# Altium schematic symbol library SCHLIB.SchLib: 2608 symbols (part 3 of 20)
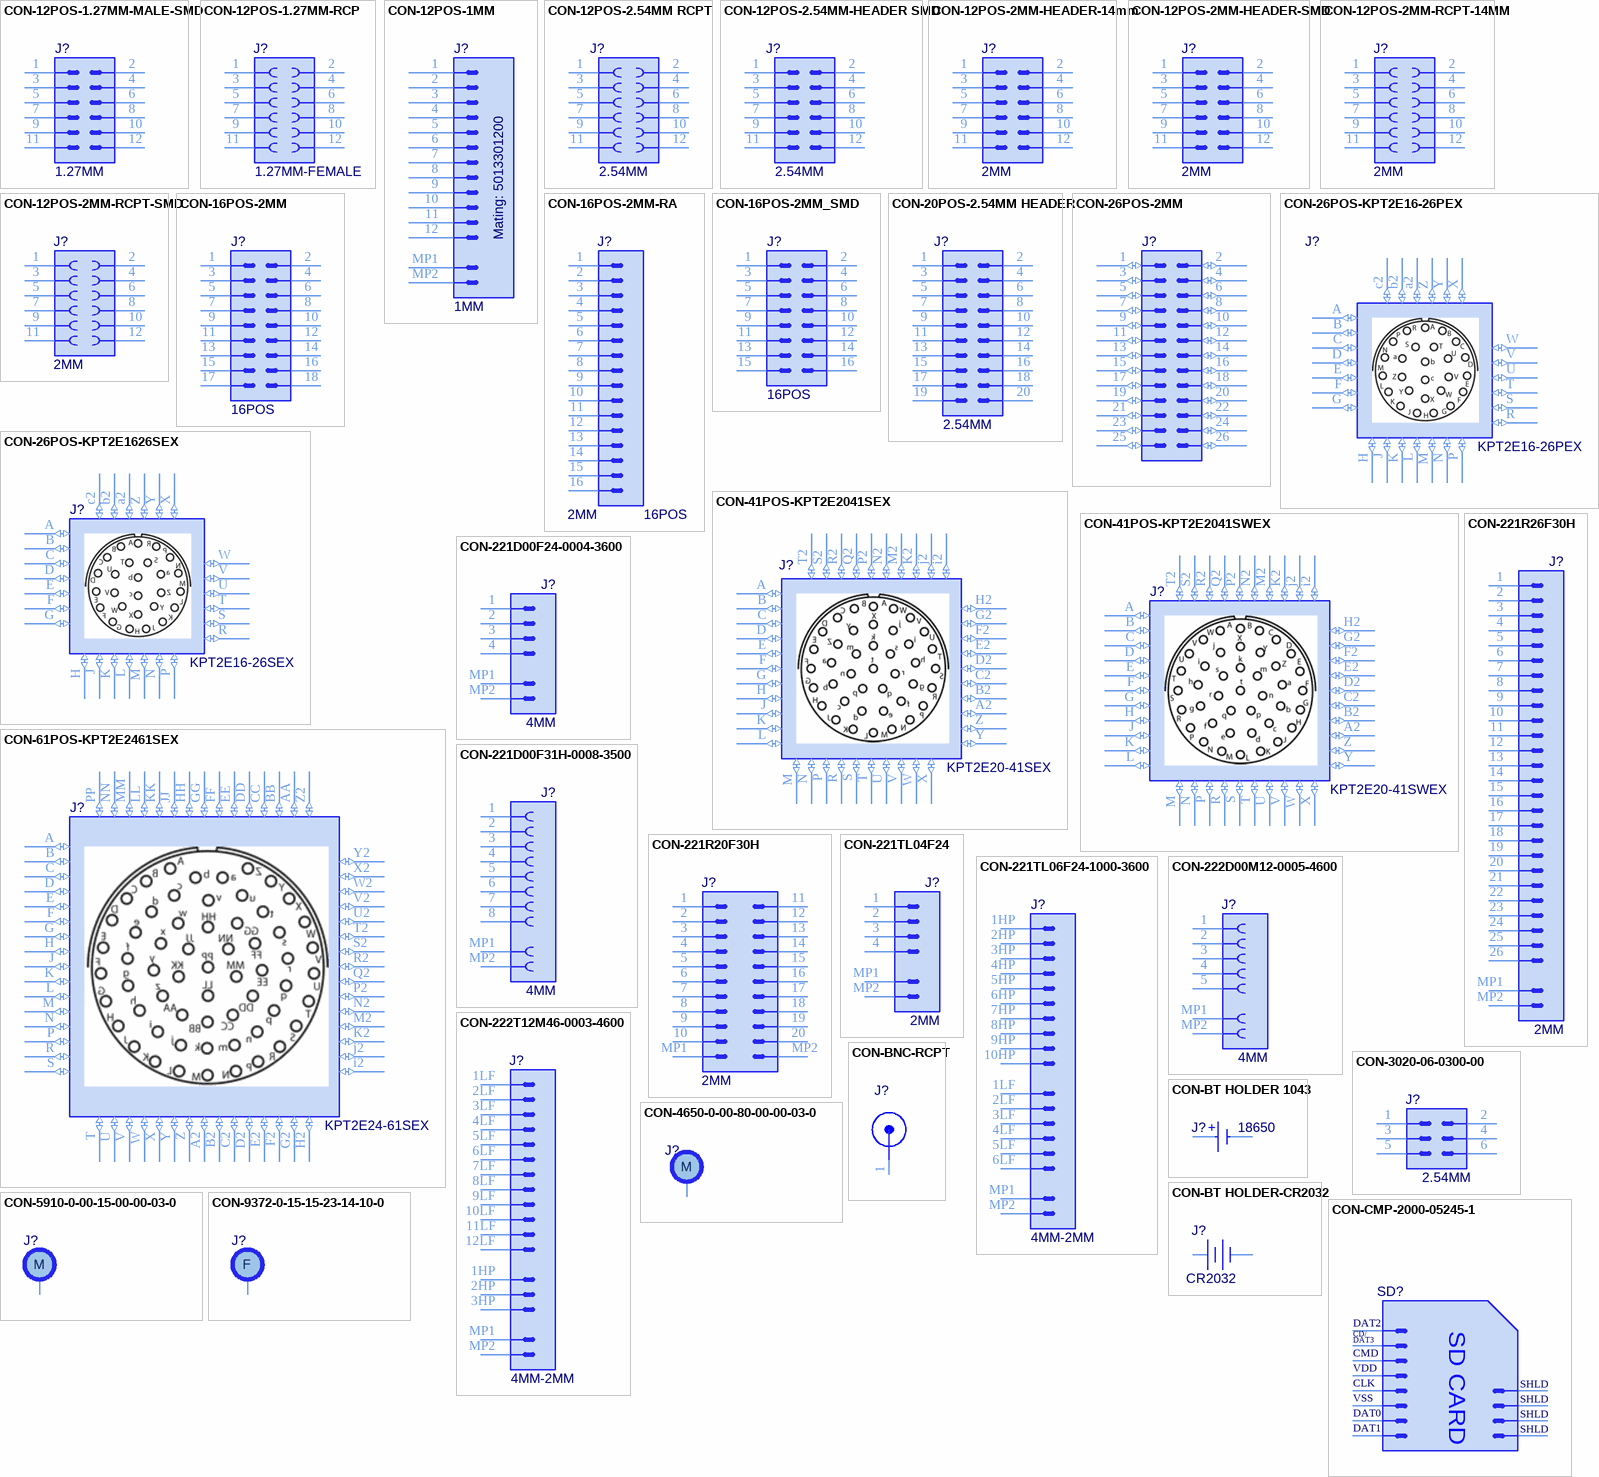
[diagram p85: symbols CON-12POS-1.27MM-MALE-SMD to CON-CMP-2000-05245-1]

## CON-61POS-KPT2E2461SEX
designator J?, comment KPT2E24-61SEX
KPT 61C 61#20 SKT RECP; Manufacturer: ITT Cannon; Body Material: Aluminium; Body Plating: Cadmium; Connector Type: Receptacle,Circular; Number of Positions: 61; Gender: Receptacle; Current Rating: 7.5A; Ratings: Environment Resistant; Washability: OK; Supplier 1: Digi-Key; Supplier Part Number 1: IKPT2E24-61SEX-ND; Manufacturer Part Number: KPT2E24-61SEX; Stock: 305; Pricing: 1=103.65, 10=90.546, 25=85.7808, 50=81.0152, 100=79.2281 (USD); RoHS: Yes; Mount: Through Hole,Panel,Flanges; Contact Material: Copper Alloy; Contact Plating: Gold; Min Operating Temperature: -55°C; Max Operating Temperature: 125°C; Termination: Solder; Number of Contacts: 61; Package Quantity: 1; Fastening Type: Bayonet; Packaging: Bulk; REACH SVHC: No SVHC; ComponentLink1URL: https://datasheet.ciiva.com/7961/1811874-7961718.pdf?src-supplier=Element14; ComponentLink1Description: https://datasheet.ciiva.com/7961/1811874-7961718.pdf?src-supplier=Element14
footprint CON-61POS-KPT2E2461SEX
pins: A (io), A2 (io), AA (io), B (io), B2 (io), BB (io), C (io), C2 (io), CC (io), D (io), D2 (io), DD (io), E (io), E2 (io), EE (io), F (io), F2 (io), FF (io), G (io), G2 (io), GG (io), H (io), H2 (io), HH (io), i2 (io), J (io), j2 (io), JJ (io), K (io), K2 (io), KK (io), L (io), LL (io), M (io), M2 (io), MM (io), N (io), N2 (io), NN (io), P (io), P2 (io), PP (io), Q2 (io), R (io), R2 (io), S (io), S2 (io), T (io), T2 (io), U (io), U2 (io), V (io), V2 (io), W (io), W2 (io), X (io), X2 (io), Y (io), Y2 (io), Z (io), Z2 (io)

## CON-221D00F24-0004-3600
designator J?, comment 4MM
CMM Series 220 MALE; Manufacturer Part Number: 221D00F24-0004-3600; Manufacturer: NICOMATIC
footprint CON-221D00F24-0004-3600
pins: 1, 2, 3, 4, MP1, MP2

## CON-221D00F31H-0008-3500
designator J?, comment 4MM
CMM 220 FEMALE 90° SMT; Manufacturer: NICOMATIC; Manufacturer Part Number: 221D00F31H-0008-3500; Mating: 222E00M16-0008-4320
footprint CON-221D00F31H-0008-3500
pins: 1, 2, 3, 4, 5, 6, 7, 8, MP1, MP2

## CON-221R20F30H
designator J?, comment 2MM
CMM 220 MALE 90° SMT; Manufacturer Part Number: 221R20F30H; Manufacturer: NICOMATIC; Mating: 222S20M16
footprint CON-221R20F30H
pins: 1, 2, 3, 4, 5, 6, 7, 8, 9, 10, 11, 12, 13, 14, 15, 16, 17, 18, 19, 20, MP1, MP2

## CON-221R26F30H
designator J?, comment 2MM
CMM 220 MALE 90° SMT; Manufacturer Part Number: 221R26F30H; Manufacturer: NICOMATIC; Mating: 222S26M16
footprint CON-221R26F30H
pins: 1, 2, 3, 4, 5, 6, 7, 8, 9, 10, 11, 12, 13, 14, 15, 16, 17, 18, 19, 20, 21, 22, 23, 24, 25, 26, MP1, MP2

## CON-221TL04F24
designator J?, comment 2MM
CMM 220 MALE STRAIGHT SMT; Manufacturer Part Number: 221TL04F24; Manufacturer: NICOMATIC; Mating: 222S04M16
footprint CON-221TL04F24
pins: 1, 2, 3, 4, MP1, MP2

## CON-221TL06F24-1000-3600
designator J?, comment 4MM-2MM
CMM 220 MALE STRAIGHT SMT; Manufacturer Part Number: 221TL06F24-1000-3600; Manufacturer: NICOMATIC; Mating: 222C06M16-1000-4320
footprint CON-221TL06F24-1000-3600
pins: 1HP, 1LF, 2HP, 2LF, 3HP, 3LF, 4HP, 4LF, 5HP, 5LF, 6HP, 6LF, 7HP, 8HP, 9HP, 10HP, MP1, MP2

## CON-222D00M12-0005-4600
designator J?, comment 4MM
CMM 220 FEMALE 90° SMT; Manufacturer Part Number: 222D00M12-0005-4600; Manufacturer: NICOMATIC; Mating: 221E00F21-0005-3320
footprint CON-222D00M12-0005-4600
pins: 1, 2, 3, 4, 5, MP1, MP2

## CON-222T12M46-0003-4600
designator J?, comment 4MM-2MM
CMM Series 220 MALE; Manufacturer Part Number: 222T12M46-0003-4600; Manufacturer: NICOMATIC; Mating: 221S12F60-0003-3320
footprint CON-222T12M46-0003-4600
pins: 1HP, 1LF, 2HP, 2LF, 3HP, 3LF, 4LF, 5LF, 6LF, 7LF, 8LF, 9LF, 10LF, 11LF, 12LF, MP1, MP2

## CON-3020-06-0300-00
designator J?, comment 2.54MM
CONN HEADER SMD 6POS 2.54MM; Manufacturer: CNC Tech; Manufacturer Part Number: 3020-06-0300-00; Number of Positions: 6; Connector Type: Male Pin; Pitch: 0.1inch; Supplier 1: Digi-Key; RoHS: Yes; Category: Connectors; Stock 1: 1374; Pricing 1: 1=0,48000, 10=0,45000, 100=0,34500, 500=0,30000, 1000=0,24750, 5000=0,21750, 10000=0,20250 (USD); Mount: Surface Mount; Contact Plating: Gold; Package Quantity: 180; Number of Rows: 2; Packaging: Tray; Termination: Solder; Row Spacing: 0.1inch; ComponentLink1URL: http://cnctech.us/pdfs/3020-XX-0300-00.pdf?src-supplier=Digi-Key; ComponentLink1Description: http://cnctech.us/pdfs/3020-XX-0300-00.pdf?src-supplier=Digi-Key; ComponentLink2URL: http://cnctech.us/idcmatching2.pdf?src-supplier=Digi-Key; ComponentLink2Description: http://cnctech.us/idcmatching2.pdf?src-supplier=Digi-Key; Supplier Part Number 1: 1175-1864-ND
footprint CON-3020-06-0300-00
pins: 1, 2, 3, 4, 5, 6

## CON-4650-0-00-80-00-00-03-0
designator J?, comment M
CONN PC PIN CIRC; Manufacturer: Mill-Max; Manufacturer Part Number: 4650-0-00-80-00-00-03-0; Insulation: Non-Insulated; Supplier 1: Digi-Key; Supplier Part Number 1: ED10167-ND; Stock: 896; Pricing: 1=0.77, 10=0.677, 25=0.6368, 50=0.6102, 100=0.5837, 250=0.5306, 500=0.4775, 1000=0.4245, 2500=0.3847 (USD); RoHS: No; Mount: Through Hole; Contact Material: Brass; Contact Plating: Tin; Packaging: Bulk; Termination: PC Pin; ComponentLink1URL: https://www.mill-max.com/assets/pdfs/223.3.pdf?src-supplier=Digi-Key; ComponentLink1Description: https://www.mill-max.com/assets/pdfs/223.3.pdf?src-supplier=Digi-Key
footprint CON-4650
pins: 1

## CON-5910-0-00-15-00-00-03-0
designator J?, comment M
SOLDER MOUNT NAIL HEAD PIN; Manufacturer: Mill-Max; Manufacturer Part Number: 5910-0-00-15-00-00-03-0; Supplier 1: Digi-Key; Supplier Part Number 1: 54-5910-0-00-15-00-00-03-0-ND; Stock: 348; Pricing: 1=0.84, 10=0.738, 25=0.6948, 50=0.6658, 100=0.6369, 250=0.579, 500=0.5211, 1000=0.4632, 2500=0.4198 (USD); RoHS: No; ComponentLink1Description: datasheet; ComponentLink1URL: https://www.mill-max.com/products/datasheet/pinsrecs/5910-0-00-15-00-00-03-0
footprint CON-5910
pins: 1

## CON-9372-0-15-15-23-14-10-0
designator J?, comment F
CONN PIN RCPT; Manufacturer: Mill-Max; Manufacturer Part Number: 9372-0-15-15-23-14-10-0; Supplier 1: Digi-Key; Supplier Part Number 1: 9372-0-15-15-23-14-10-0-ND; Stock: 1000; Pricing: 1=1.53, 10=1.388, 25=1.3032, 50=1.2466, 100=1.1899, 250=1.0766, 500=0.9916, 1000=0.8499 (USD); RoHS: Yes; Mount: Through Hole; Packaging: Bulk; Package Quantity: 500; ComponentLink1URL: https://datasheet.ciiva.com/12491/159n-58938-12491735.pdf?src-supplier=Mouser; ComponentLink1Description: https://datasheet.ciiva.com/12491/159n-58938-12491735.pdf?src-supplier=Mouser
footprint CON-9372
pins: 1

## CON-BNC-RCPT
designator J?, comment CONN BNC RCPT STR 75 OHM SOLDER  (value not drawn)
BNC Connector Jack, Female Socket 75Ohm Panel Mount Solder Cup; Manufacturer 1: Pomona Electronics; Manufacturer Part Number 1: 6736; Body Material: Brass; Plating: Nickel; Dielectric Material: PTFE; Voltage Rating: 500V; Connector Type: BNC,Socket,Plug,Coaxial; Polarity: Standard; Impedance: 75R; Max Frequency: 3GHz; Insulation Resistance: 5GR; Washability: OK; Supplier 1: Digi-Key; Stock 1: 290; Pricing 1: 1=6,49000, 25=6,16560, 50=5,84100, 100=5,58140 (USD); RoHS: Yes; Mount: Panel,Flanges,Bulkhead; Contact Plating: Gold; Contact Material: Copper,Brass; Body Plating: Nickel; Housing Color: Silver; Material: Brass; Insulation Material: Teflon; Housing Material: Brass; Min Operating Temperature: -65°C; Max Operating Temperature: 155°C; Package Quantity: 5; Gender: Female; Termination: Solder; Orientation: Vertical; Fastening Type: Bayonet; Packaging: Bulk; Frequency: 3GHz; REACH SVHC: No SVHC; Lead Free: Lead Free; ComponentLink1URL: https://datasheet.ciiva.com/644/d6735-6736-004-644064.pdf?src-supplier=Digi-Key; ComponentLink1Description: https://datasheet.ciiva.com/644/d6735-6736-004-644064.pdf?src-supplier=Digi-Key; ComponentLink2URL: https://datasheet.ciiva.com/7659/63814-7659204.pdf?src-supplier=Element14; ComponentLink2Description: https://datasheet.ciiva.com/7659/63814-7659204.pdf?src-supplier=Element14; ComponentLink3URL: https://datasheet.ciiva.com/14568/70197102-14568615.pdf?src-supplier=Allied+Electronics; ComponentLink3Description: https://datasheet.ciiva.com/14568/70197102-14568615.pdf?src-supplier=Allied+Electronics; ComponentLink4URL: https://datasheet.ciiva.com/5175/2391574-6735-36-54379-5175725.pdf?src-supplier=Mouser; ComponentLink4Description: https://datasheet.ciiva.com/5175/2391574-6735-36-54379-5175725.pdf?src-supplier=Mouser; Supplier Part Number 1: 501-1146-ND
footprint CON-BNC
pins: 1

## CON-BT HOLDER 1043
designator J?, comment 18650
HOLDER BATTERY 1CELL 18650 TH; Manufacturer 1: Keystone Electronics; Manufacturer Part Number 1: 1043; Body Material: Nylon; Number of Cells: 1; Washability: OK; Supplier 1: Digi-Key; Supplier Part Number 1: 36-1043-ND; RoHS: Yes; Category: Uncategorized; Stock 1: 5416; Pricing 1: 1=2.58000, 25=2.16760, 100=1.91000, 250=1.82000, 500=1.67000, 1000=1.52000, 2500=1.30900, 5000=1.19000 (USD); Mount: Through Hole,PCB; Number of Pins: 1; Contact Material: Stainless Steel; Contact Plating: Gold; Material: Nylon; Min Operating Temperature: -50°C; Max Operating Temperature: 145°C; Packaging: Tray; Package Quantity: 50; Termination: PC Pin; ComponentLink1URL: https://datasheet.ciiva.com/4/1043-4710.pdf?src-supplier=Digi-Key; ComponentLink1Description: https://datasheet.ciiva.com/4/1043-4710.pdf?src-supplier=Digi-Key; ComponentLink2URL: https://datasheet.ciiva.com/3353/1043-eng-tds-3353208.pdf?src-supplier=Distrelec; ComponentLink2Description: https://datasheet.ciiva.com/3353/1043-eng-tds-3353208.pdf?src-supplier=Distrelec; ComponentLink3URL: https://datasheet.ciiva.com/4642/1043-4642493.pdf?src-supplier=Mouser; ComponentLink3Description: https://datasheet.ciiva.com/4642/1043-4642493.pdf?src-supplier=Mouser; ComponentLink4URL: https://datasheet.ciiva.com/41803/1043-41803215.pdf?src-supplier=Digi-Key; ComponentLink4Description: https://datasheet.ciiva.com/41803/1043-41803215.pdf?src-supplier=Digi-Key
pins: 1 +, 2 -

## CON-BT HOLDER-CR2032
designator J?, comment CR2032
BATTERY RETAINER COIN 20MM SMD; Manufacturer: Keystone Electronics; Manufacturer Part Number: 3002; Body Material: Bronze; Number of Batteries: 1; Washability: OK; Supplier 1: Digi-Key; Stock 1: 15982; Pricing 1: 1=0.50000, 10=0.40900, 50=0.35880, 100=0.35250, 250=0.31184, 500=0.29302, 1000=0.27423, 2500=0.24915, 5000=0.23192 (USD); RoHS: Yes; Mount: Surface Mount; Material: Bronze; Contact Material: Bronze; Package Quantity: 100; Packaging: Bulk; Termination: SMD/SMT; Number of Cells: 1; Diameter: 20mm; Height: 3.96mm; REACH SVHC: No SVHC; Lead Free: Lead Free; ComponentLink1URL: https://datasheet.ciiva.com/20221/18-3570e-20221602.pdf?src-supplier=Rapid+Electronics; ComponentLink1Description: https://datasheet.ciiva.com/20221/18-3570e-20221602.pdf?src-supplier=Rapid+Electronics; ComponentLink2URL: https://datasheet.ciiva.com/3/3002-3958.pdf?src-supplier=Digi-Key; ComponentLink2Description: https://datasheet.ciiva.com/3/3002-3958.pdf?src-supplier=Digi-Key; ComponentLink3URL: https://datasheet.ciiva.com/11714/0900766b8002ef78-11714696.pdf?src-supplier=RSComponents; ComponentLink3Description: https://datasheet.ciiva.com/11714/0900766b8002ef78-11714696.pdf?src-supplier=RSComponents; ComponentLink4URL: https://datasheet.ciiva.com/1391/1718263-1391631.pdf?src-supplier=Element14; ComponentLink4Description: https://datasheet.ciiva.com/1391/1718263-1391631.pdf?src-supplier=Element14; ComponentLink5URL: https://datasheet.ciiva.com/3353/06950232-3353157.pdf?src-supplier=Distrelec; ComponentLink5Description: https://datasheet.ciiva.com/3353/06950232-3353157.pdf?src-supplier=Distrelec; ComponentLink6URL: https://datasheet.ciiva.com/14603/70182864-14603662.pdf?src-supplier=Allied+Electronics; ComponentLink6Description: https://datasheet.ciiva.com/14603/70182864-14603662.pdf?src-supplier=Allied+Electronics; Supplier Part Number 1: 36-3002-ND
footprint CR2032-SMD (COIN HOLDER)
pins: 1 1,3, 2, 3

## CON-CMP-2000-05245-1
designator SD?, comment L-KLS1-TF-007-H1.8-R  (value not drawn)
CONN MICRO SD CARD HINGED TYPE; Manufacturer: Molex; Manufacturer Part Number: 47219-2001; Number of Contacts: 8; Current Rating: 500mA; Voltage Rating (DC): 100V; Gender: Female; Shielding: Shielded; Pitch: 1.09mm; Washability: OK; ComponentLink1URL: https://datasheet.ciiva.com/24444/260460472192001-memory-card-socket-24444480.pdf?src-supplier=Onlinecomponents.com; ComponentLink1Description: https://datasheet.ciiva.com/24444/260460472192001-memory-card-socket-24444480.pdf?src-supplier=Onlinecomponents.com; ComponentLink2URL: https://datasheet.ciiva.com/30153/0472192001-memory-card-socket-30153816.pdf?src-supplier=Onlinecomponents.com; ComponentLink2Description: https://datasheet.ciiva.com/30153/0472192001-memory-card-socket-30153816.pdf?src-supplier=Onlinecomponents.com; ComponentLink3URL: https://datasheet.ciiva.com/16655/0472192001-memory-card-socket-16655591.pdf?src-supplier=Avnet+Europe; ComponentLink3Description: https://datasheet.ciiva.com/16655/0472192001-memory-card-socket-16655591.pdf?src-supplier=Avnet+Europe; Supplier 1: Digi-Key; Stock 1: 29756; Pricing 1: 1=1.16000, 10=1.02200, 25=0.96160, 50=0.92140, 100=0.88140, 250=0.80124 (USD); RoHS: Yes; Mount: Surface Mount; Contact Material: Copper Alloy; Contact Plating: Gold; Housing Material: Thermoplastic; Color: Black; Material: Thermoplastic; Min Operating Temperature: -20°C; Max Operating Temperature: 85°C; Orientation: Right Angle; Packaging: Tape and Reel; Package Quantity: 2400; Termination: SMD/SMT; Number of Circuits: 8; Length: 13.6mm; Depth: 1.9mm; Width: 14.5mm; Radiation Hardening: No; REACH SVHC: No SVHC; Lead Free: Lead Free; Halogen Free: Low Halogen; ELV: Compliant; Supplier Part Number 1: WM6698CT-ND
footprint MOLX-47219-2001-8_V (Footprint not found)
pins: 1 DAT2, 2 CD/DAT3, 3 CMD, 4 VDD, 5 CLK, 6 VSS, 7 DAT0, 8 DAT1, 9 SHLD, 10 SHLD, 11 SHLD, 12 SHLD
text: SD CARD; CD/; DAT3

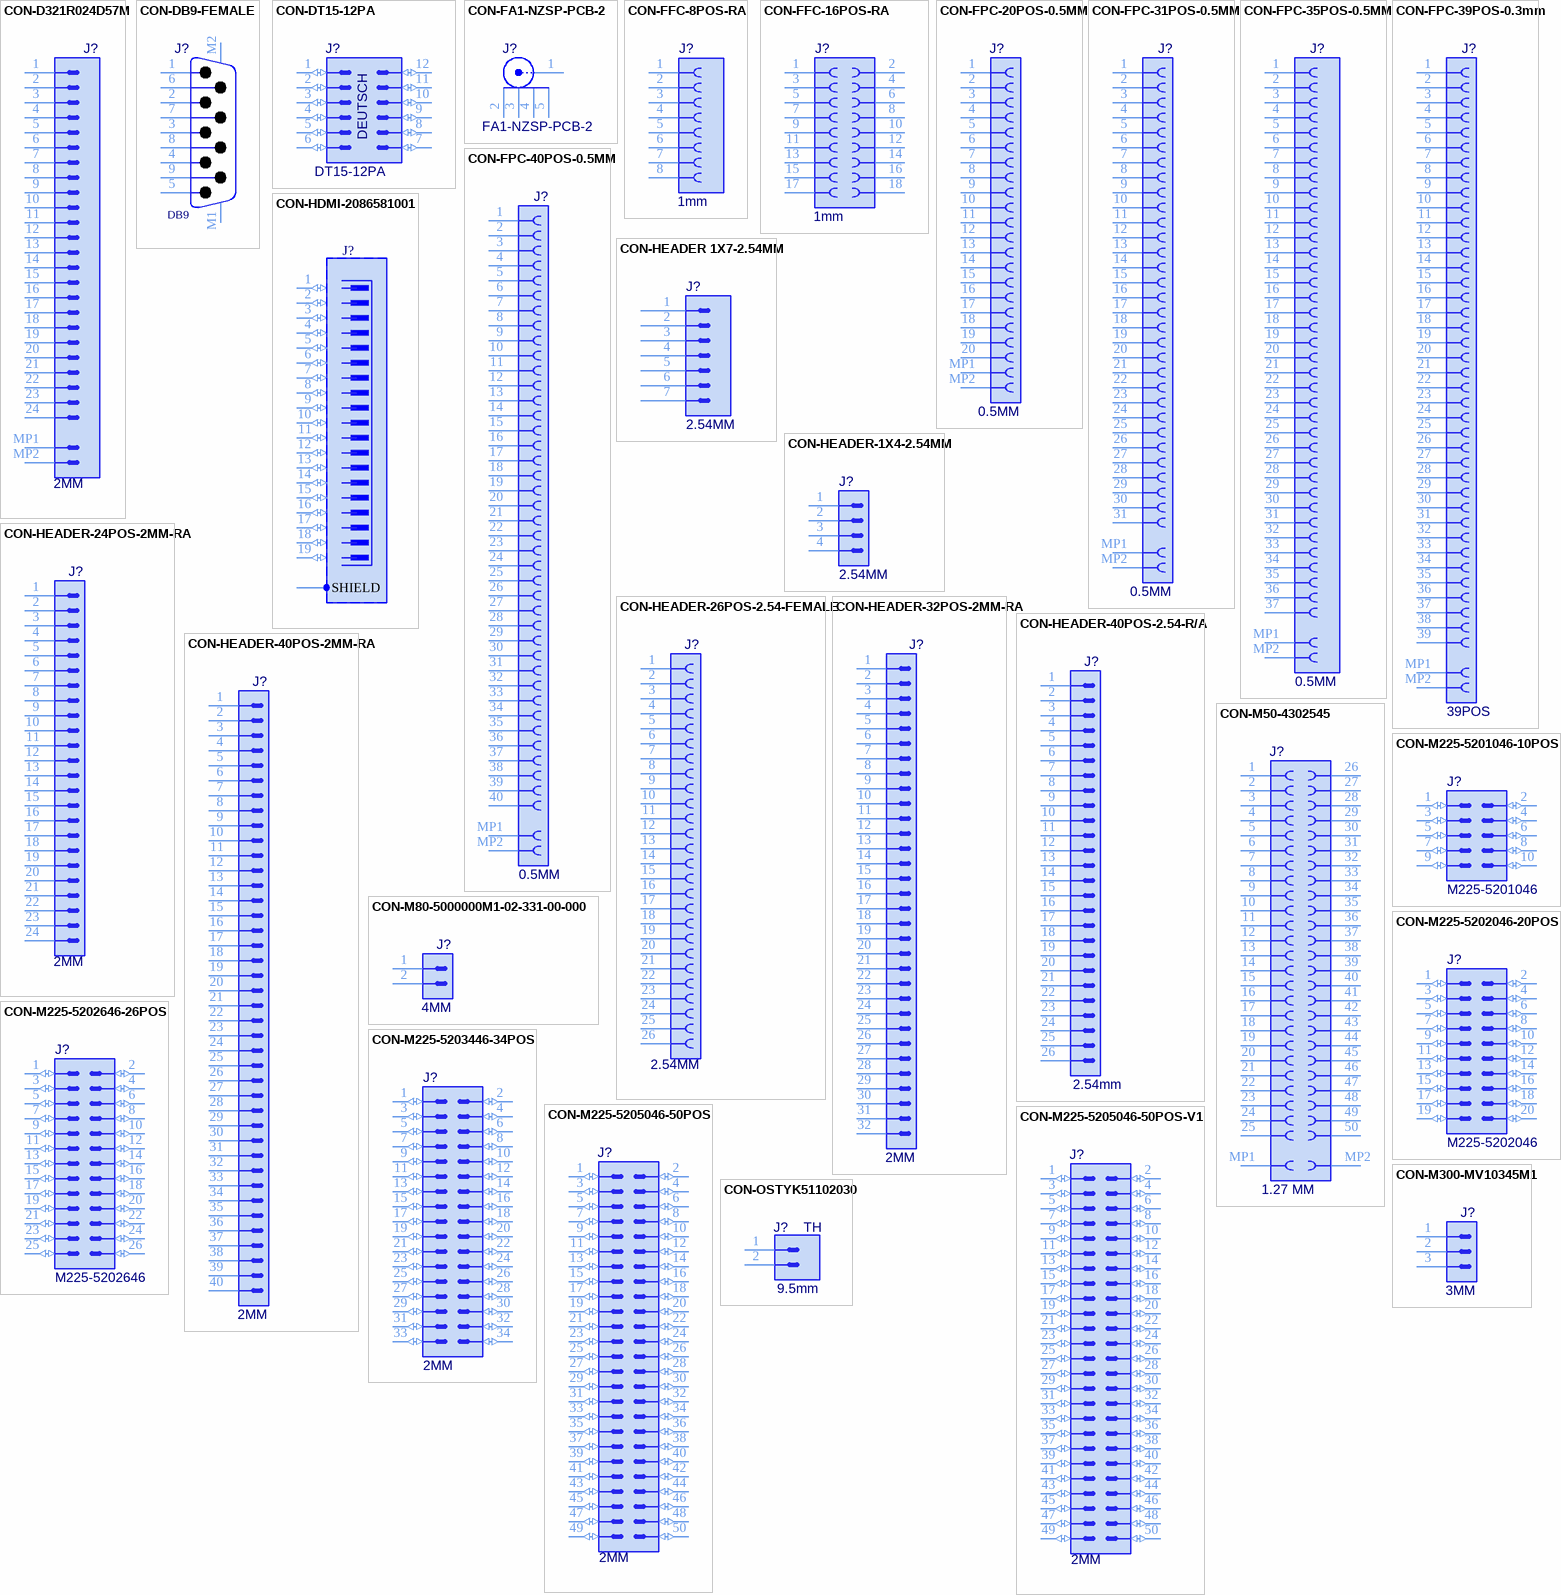
[diagram p8: symbols CON-D321R024D57M to CON-OSTYK51102030]

## CON-D321R024D57M
designator J?, comment 2MM
DMM 320 MALE 90° SMT; Manufacturer: NICOMATIC; Manufacturer Part Number: D321R024D57M; Mating: D322SP024D53
footprint CON-D321R024D57M
pins: 1, 2, 3, 4, 5, 6, 7, 8, 9, 10, 11, 12, 13, 14, 15, 16, 17, 18, 19, 20, 21, 22, 23, 24, MP1, MP2

## CON-DB9-FEMALE
designator J?, comment DB9
WR-DSUB FEMALE ANGLED PCB CONNEC; Manufacturer: Wurth Electronics; Manufacturer Part Number: 618009211821; ComponentLink1Description: Manufacturer; ComponentLink1URL: http://www.we-online.de; ComponentLink2Description: Datasheet; ComponentLink2URL: https://katalog.we-online.de/em/datasheet/6180xx211821.pdf; Supplier 1: Digi-Key; Supplier Part Number 1: 732-618009211821-ND; Stock: 78; Pricing: 1=2.47, 10=2.343, 50=2.081, 100=1.815, 250=1.557, 500=1.387 (USD); RoHS: No
footprint CON-DB9-618009211821 (09p 8.08mm bracket, board lock & UNC4-40 Rivet without hex screw)
pins: 1, 2, 3, 4, 5, 6, 7, 8, 9, M1, M2

## CON-DT15-12PA
designator J?, comment DT15-12PA
CONN HEADER VERT 12POS 4.44MM; Manufacturer: TE Connectivity Deutsch; Connector System: Wire-to-Device; Hybrid Connector: No; Number of Positions: 12; Sealable: Yes (With); Strain Relief: No (Without); Pitch: 0.175inch; Row Spacing: 0.359inch; Supplier 1: Digi-Key; Supplier Part Number 1: 1734-1027-ND; Manufacturer Part Number: DT15-12PA; Stock: 1401; Pricing: 1=11.11, 10=10.626, 25=9.66, 50=9.177, 100=8.9355, 250=7.9695, 500=7.4865, 1000=6.6171, 2500=6.279 (USD); RoHS: No; Housing Material: Thermoplastic; Housing Color: Grey; Contact Material: Copper Alloy; Color: Grey; Contact Plating: Nickel; Min Operating Temperature: -55°C; Max Operating Temperature: 125°C; Number of Rows: 2; Polarized: No; Serviceable: No; Orientation: Straight; Length: 59.21mm; Height: 30.12mm; Width: 35.26mm; Flammability Rating: UL94 V-0; ELV: Compliant; ComponentLink1URL: https://www.te.com/commerce/DocumentDelivery/DDEController?Action=srchrtrv&DocNm=DT15-12PX&DocType=Customer+Drawing&DocLang=English&src-supplier=Digi-Key; ComponentLink1Description: https://www.te.com/commerce/DocumentDelivery/DDEController?Action=srchrtrv&DocNm=DT15-12PX&DocType=Customer+Drawing&DocLang=English&src-supplier=Digi-Key
footprint CON-DT15-12A (12 Position 4.44mm)
pins: 1 (io), 2 (io), 3 (io), 4 (io), 5 (io), 6 (io), 7 (io), 8 (io), 9 (io), 10 (io), 11 (io), 12 (io)
text: DEUTSCH

## CON-FA1-NZSP-PCB-2
designator J?, comment FA1-NZSP-PCB-2
CONN FAKRA PLUG 50 OHM PCB; Manufacturer: Amphenol; Body Material: Brass; Body Plating: Gold; Dielectric Material: PTFE; Connector Type: SMB,Plug,Male Pin; Impedance: 50R; Max Frequency: 4GHz; Number of Ports: 1; Mating Cycles: 100; Supplier 1: Mouser; Manufacturer Part Number: FA1-NZSP-PCB-2; RoHS: Yes; Stock 1: 212; Pricing 1: 1=3.57000, 10=3.00000, 50=3.00000, 100=2.86000, 1000=2.04000, 10000=2.04000 (USD); Mount: Through Hole; Contact Plating: Gold; Contact Material: Brass; Housing Color: Blue; Min Operating Temperature: -40°C; Max Operating Temperature: 85°C; Fastening Type: Ramp; Termination: Solder; RoHS Compliant: No; ComponentLink1URL: https://www.amphenolrf.com/downloads/dl/file/id/193/product/1774/fa1_nasp_pcb_2_customer_drawing.pdf?src-supplier=Digi-Key; ComponentLink1Description: https://www.amphenolrf.com/downloads/dl/file/id/193/product/1774/fa1_nasp_pcb_2_customer_drawing.pdf?src-supplier=Digi-Key; ComponentLink2URL: https://4donline.ihs.com/images/VipMasterIC/IC/AMPH/AMPHS13882/AMPHS13882-1.pdf?hkey=52A5661711E402568146F3353EA87419&src-supplier=Newark; ComponentLink2Description: https://4donline.ihs.com/images/VipMasterIC/IC/AMPH/AMPHS13882/AMPHS13882-1.pdf?hkey=52A5661711E402568146F3353EA87419&src-supplier=Newark; Supplier Part Number 1: 523-FA1-NZSP-PCB-2
footprint CON-FAKRA (Connector, HF, TH)
pins: 1, 2, 3, 4, 5

## CON-FFC-8POS-RA
designator J?  Pitch: 1mm  (hidden comment: *)
CONN FFC FPC TOP 8POS 1.00MM R/A; Manufacturer: Molex; Manufacturer Part Number: 52207-0860; Current Rating: 1A; Voltage Rating: 125V; Contact Resistance: 20mR; Number of Positions: 8; Gender: Receptacle; Stackable: No; Washability: OK; Supplier 1: Digi-Key; Stock 1: 21484; Pricing 1: 1=1.17, 10=1.028, 25=0.9672, 50=0.927, 100=0.8867, 250=0.80608, 500=0.72548 (USD); Contact Material: Bronze; Contact Plating: Gold; Housing Material: Nylon; Material: Bronze; Min Operating Temperature: -20°C; Max Operating Temperature: 85°C; Number of Rows: 1; Package Quantity: 1000; Packaging: Tape and Reel; Termination: Solder; Number of Contacts: 8; Orientation: Right Angle; Number of Circuits: 8; Length: 15.5mm; Depth: 7.5mm; Flammability Rating: UL94 V-0; REACH SVHC: Unknown; ELV: Compliant; ComponentLink1URL: http://uk.rs-online.com/webdocs/13c4/0900766b813c4266.pdf; ComponentLink1Description: http://uk.rs-online.com/webdocs/13c4/0900766b813c4266.pdf; ComponentLink2URL: http://www.onlinecomponents.com/productFiles/mf-MOL/408160522070860_ffc_fpc_nectors.pdf; ComponentLink2Description: http://www.onlinecomponents.com/productFiles/mf-MOL/408160522070860_ffc_fpc_nectors.pdf; ComponentLink3URL: http://www.mouser.com/ds/2/276/0522070860_FFC_FPC_CONNECTORS-149496.pdf; ComponentLink3Description: http://www.mouser.com/ds/2/276/0522070860_FFC_FPC_CONNECTORS-149496.pdf; ComponentLink4URL: http://www.farnell.com/datasheets/2133202.pdf; ComponentLink4Description: http://www.farnell.com/datasheets/2133202.pdf; ComponentLink5URL: https://www.verical.com/server-webapp/html/getDatasheet?partID=761365; ComponentLink5Description: https://www.verical.com/server-webapp/html/getDatasheet?partID=761365; ComponentLink6URL: http://www.molex.com/webdocs/datasheets/pdf/en-us/0522070860_FFC_FPC_CONNECTORS.pdf; ComponentLink6Description: http://www.molex.com/webdocs/datasheets/pdf/en-us/0522070860_FFC_FPC_CONNECTORS.pdf; Supplier Part Number 1: WM3375DKR-ND
pins: 1, 2, 3, 4, 5, 6, 7, 8

## CON-FFC-16POS-RA
designator J?, comment Lead Pitch: 1mm  (hidden comment: FFC)
CONN FFC FPC TOP 16POS 1.00MM R/A; Manufacturer: TE Connectivity; Manufacturer Part Number: 1-84953-6; Body Plating: Tin; Contact Current Rating: 1A; Connector Type: Receptacle; Wire/Cable Type: Flat Flex; Connector System: Flex-to-Board; Plating Thickness: 2um; Number of Positions: 16; Mating Alignment: Yes (With); PCB Mount Alignment: No (Without); PCB Mount Retention: With; PCB Mounting Orientation: Right Angle; Gender: Female; Shielding: Unshielded; Voltage Rating: 200V; Pitch: 0.039inch; Supplier 1: Digi-Key; Supplier Part Number 1: A100322CT-ND; Stock: 10507; Pricing: 1=1.72, 10=1.56, 25=1.4648, 50=1.401, 100=1.3373, 250=1.2099, 500=1.1144 (USD); Mount: Surface Mount; Housing Color: Natural; Material: Thermoplastic; Contact Material: Bronze; Contact Plating: Tin; Color: Natural; Housing Material: Polymer; Min Operating Temperature: -40°C; Max Operating Temperature: 85°C; Orientation: Right Angle; Termination: SMD/SMT; Contact Location: Top; Sealable: No (Without); Number of Contacts: 16; Shrouded: Yes (With); Number of Rows: 1; Packaging: Tape and Reel; Package Quantity: 1200; Current Rating: 1A; Length: 0.9417inch; Height: 2.56mm; Depth: 5.4mm; Width: 0.2575inch; Radiation Hardening: No; REACH SVHC: Unknown; ELV: Compliant; Lead Free: Lead Free; Flammability Rating: UL94 V-0; ComponentLink1URL: https://datasheet.ciiva.com/11745/0900766b806c61ee-11745312.pdf?src-supplier=RSComponents; ComponentLink1Description: https://datasheet.ciiva.com/11745/0900766b806c61ee-11745312.pdf?src-supplier=RSComponents; ComponentLink2URL: https://datasheet.ciiva.com/669/eng-cd-84953-a3-669481.pdf?src-supplier=Digi-Key; ComponentLink2Description: https://datasheet.ciiva.com/669/eng-cd-84953-a3-669481.pdf?src-supplier=Digi-Key; ComponentLink3URL: https://datasheet.ciiva.com/1437/586796-1437401.pdf?src-supplier=Element14; ComponentLink3Description: https://datasheet.ciiva.com/1437/586796-1437401.pdf?src-supplier=Element14; ComponentLink4URL: https://datasheet.ciiva.com/14483/eng-ds-1-1773440-6-0506-14483305.pdf?src-supplier=Farnell; ComponentLink4Description: https://datasheet.ciiva.com/14483/eng-ds-1-1773440-6-0506-14483305.pdf?src-supplier=Farnell; ComponentLink5URL: https://datasheet.ciiva.com/669/eng-cd-84953-a3-669482.pdf?src-supplier=Digi-Key; ComponentLink5Description: https://datasheet.ciiva.com/669/eng-cd-84953-a3-669482.pdf?src-supplier=Digi-Key; ComponentLink6URL: https://datasheet.ciiva.com/1437/586796-1437402.pdf?src-supplier=Element14; ComponentLink6Description: https://datasheet.ciiva.com/1437/586796-1437402.pdf?src-supplier=Element14; ComponentLink7URL: https://datasheet.ciiva.com/669/eng-cd-84953-a3-669483.pdf?src-supplier=Digi-Key; ComponentLink7Description: https://datasheet.ciiva.com/669/eng-cd-84953-a3-669483.pdf?src-supplier=Digi-Key; ComponentLink8URL: https://datasheet.ciiva.com/30233/eng-ds-1-1773440-6-0506-30233935.pdf?src-supplier=Onlinecomponents.com; ComponentLink8Description: https://datasheet.ciiva.com/30233/eng-ds-1-1773440-6-0506-30233935.pdf?src-supplier=Onlinecomponents.com; ComponentLink9URL: https://datasheet.ciiva.com/16546/eng-ds-1-1773440-6-0506-16546839.pdf?src-supplier=Avnet+Europe; ComponentLink9Description: https://datasheet.ciiva.com/16546/eng-ds-1-1773440-6-0506-16546839.pdf?src-supplier=Avnet+Europe; ComponentLink10URL: http://datasheet.octopart.com/1-84953-6-TE-Connectivity-datasheet-502047.pdf?src-supplier=Electro+Sonic; ComponentLink10Description: http://datasheet.octopart.com/1-84953-6-TE-Connectivity-datasheet-502047.pdf?src-supplier=Electro+Sonic; ComponentLink11URL: http://sigma.octopart.com/13533106/technical_drawing/TE-Connectivity-1-84953-6.pdf?src-supplier=TE+Connectivity; ComponentLink11Description: http://sigma.octopart.com/13533106/technical_drawing/TE-Connectivity-1-84953-6.pdf?src-supplier=TE+Connectivity; ComponentLink12URL: http://datasheet.octopart.com/1-84953-6-TE-Connectivity-datasheet-17451040.pdf?src-supplier=TE+Connectivity; ComponentLink12Description: http://datasheet.octopart.com/1-84953-6-TE-Connectivity-datasheet-17451040.pdf?src-supplier=TE+Connectivity; ComponentLink13URL: http://datasheet.octopart.com/1-84953-6-TE-Connectivity-datasheet-137167967.pdf?src-supplier=TE+Connectivity; ComponentLink13Description: http://datasheet.octopart.com/1-84953-6-TE-Connectivity-datasheet-137167967.pdf?src-supplier=TE+Connectivity; ComponentLink14URL: http://datasheet.octopart.com/1-84953-6-Tyco-Electronics-datasheet-513267.pdf?src-supplier=Element14; ComponentLink14Description: http://datasheet.octopart.com/1-84953-6-Tyco-Electronics-datasheet-513267.pdf?src-supplier=Element14; ComponentLink15URL: http://datasheet.octopart.com/1-84953-6-Tyco-Electronics-datasheet-5316480.pdf?src-supplier=Farnell; ComponentLink15Description: http://datasheet.octopart.com/1-84953-6-Tyco-Electronics-datasheet-5316480.pdf?src-supplier=Farnell; ComponentLink16URL: http://datasheet.octopart.com/1-84953-6-Tyco-Electronics-datasheet-13694045.pdf?src-supplier=Farnell; ComponentLink16Description: http://datasheet.octopart.com/1-84953-6-Tyco-Electronics-datasheet-13694045.pdf?src-supplier=Farnell; ComponentLink17URL: http://datasheet.octopart.com/1-84953-6-Tyco-Electronics-datasheet-537331.pdf?src-supplier=Farnell; ComponentLink17Description: http://datasheet.octopart.com/1-84953-6-Tyco-Electronics-datasheet-537331.pdf?src-supplier=Farnell; ComponentLink18URL: http://datasheet.octopart.com/1-84953-6-Tyco-Electronics-datasheet-542113.pdf?src-supplier=Farnell; ComponentLink18Description: http://datasheet.octopart.com/1-84953-6-Tyco-Electronics-datasheet-542113.pdf?src-supplier=Farnell